# Altium footprint library THU.PcbLib: 477 footprints (part 4 of 30)
Each footprint in its own frame and in the unit in brackets; x right, y up, seen from the top. Pads: shape width x height; smd on the part's side, far side on the other; paste and mask are expansions set on the pad; w line width, h text height; cw(c..) or ccw(c..) is an arc to the next point about the centre after c.
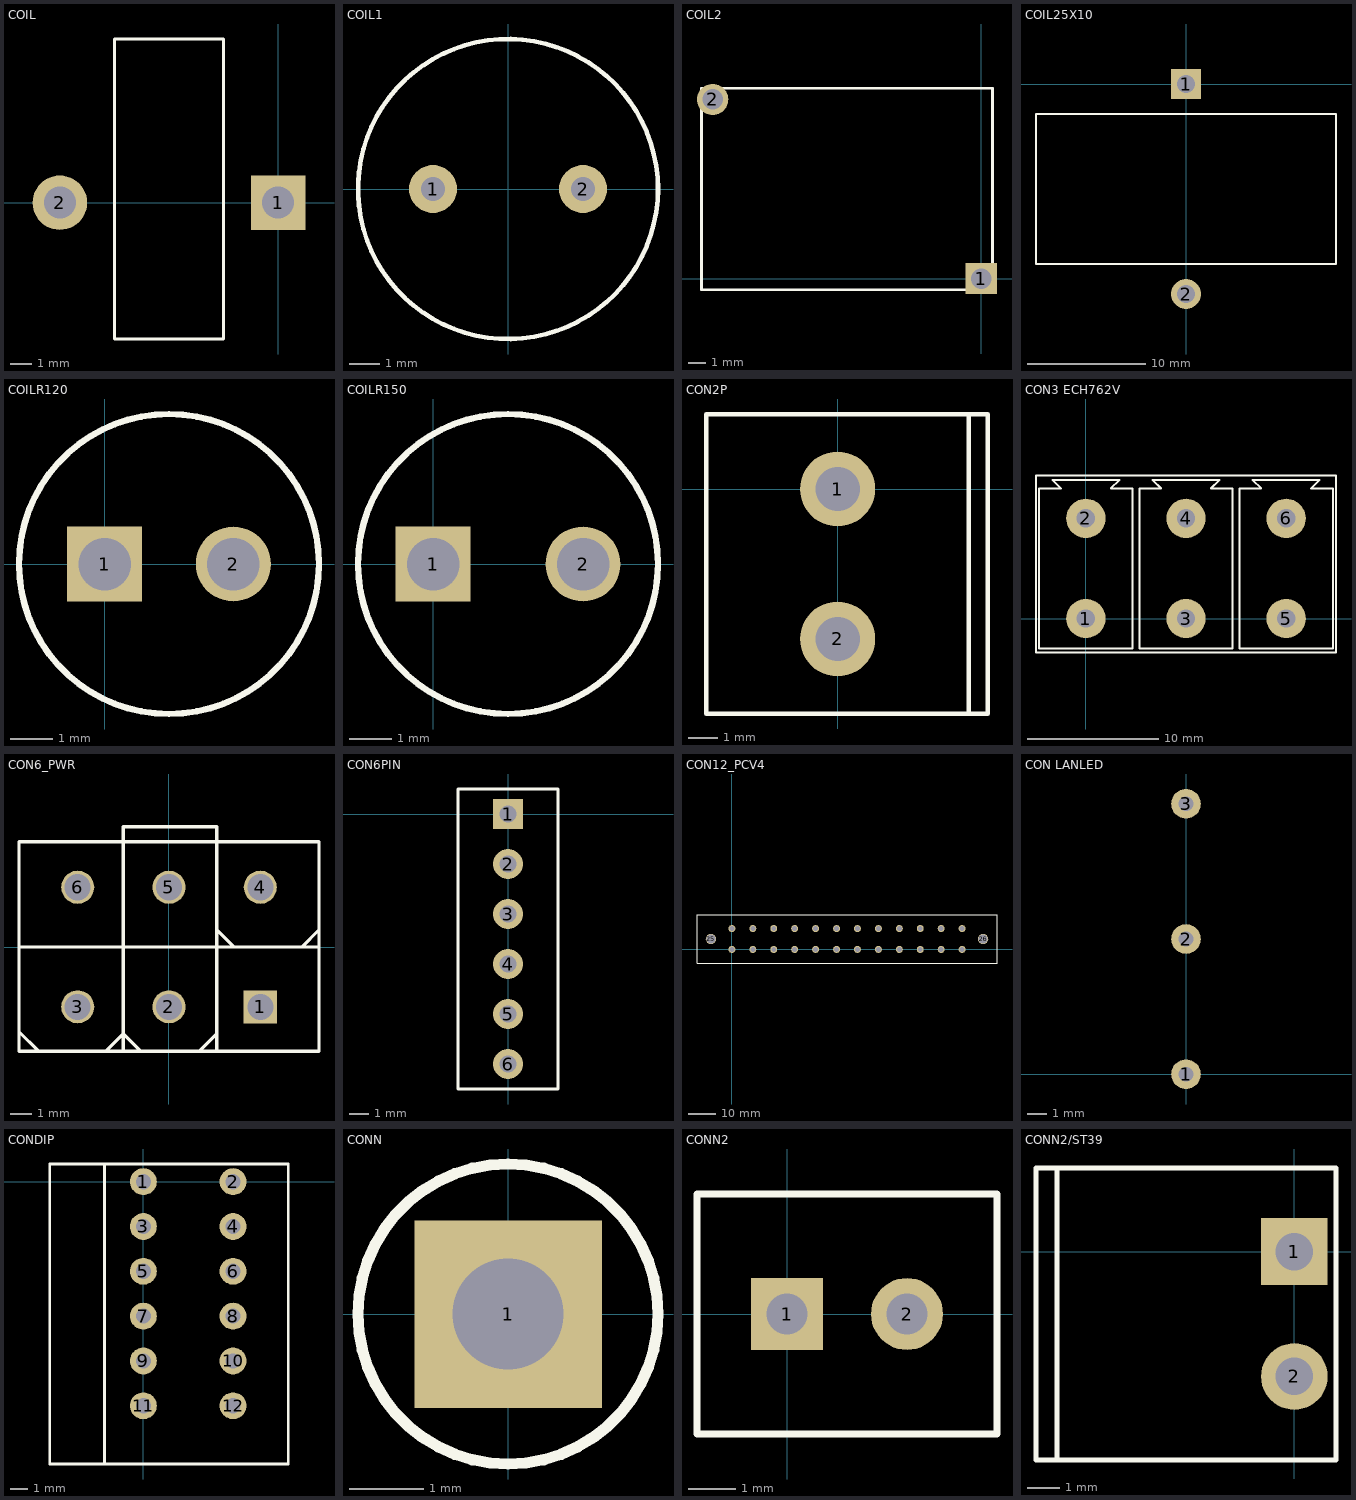
[diagram p3: the footprints below, top view; thin cyan lines are the x and y axes]

## COIL [mil]
pads (2):
  rect 100x100 hole 59: 1(0,0)
  round 100 hole 59: 2(-400,0)
TopOverlay:
  lines w6: -300,-250 -300,300 -100,300 -100,-250 -300,-250

## COIL1 [mm]
pads (2):
  round 1.6 hole 0.8: 1(-2.5,0) 2(2.5,0)
TopOverlay:
  circle w0.152: c0,0 r5

## COIL2 [mil]
pads (2):
  rect 70x70 hole 46: 1(0,0)
  round 70 hole 46: 2(-600,400)
TopOverlay:
  lines w6: -625,-25 25,-25 25,425 -625,425 -625,-25

## COIL25X10 [mil]
pads (2):
  rect 100x100 hole 59: 1(0,0)
  round 100 hole 59: 2(0,-700)
TopOverlay:
  lines w6: -500,-600 -500,-100 500,-100 500,-600 -500,-600

## COILR120 [mil]
pads (2):
  rect 70x70 hole 49: 1(0,0)
  round 70 hole 49: 2(120,0)
TopOverlay:
  circle w6: c60,0 r140

## COILR150 [mil]
pads (2):
  rect 70x70 hole 49: 1(0,0)
  round 70 hole 49: 2(140,0)
TopOverlay:
  circle w6: c70,0 r140

## CON2P [mil]
pads (2):
  round 100 hole 59: 1(0,0) 2(0,-200)
TopOverlay:
  lines w6: 175,-300 175,100 ; -175,-300 -175,100 200,100 200,-300 -175,-300

## CON3 ECH762V [mm] "ALTRONICS P/N P4232, ECH762V"
height 29
pads (6):
  round 3 hole 1.4: 1(0,0) 2(0,7.62) 3(7.62,0) 4(7.62,7.62) 5(15.24,0) 6(15.24,7.62)
TopOverlay:
  lines w0.152: -3.8,-2.6 19.04,-2.6 19.04,0 19.04,10.9 -3.8,10.9 -3.8,0 -3.8,-2.6 ; -3.556,-2.286 -3.556,9.906 -1.905,9.906 -2.54,10.541 2.54,10.541 1.905,9.906 3.556,9.906 3.556,-2.286 -3.556,-2.286 ; 4.064,-2.286 11.176,-2.286 11.176,9.906 9.525,9.906 10.16,10.541 5.08,10.541 5.715,9.906 4.064,9.906 4.064,-2.286 ; 11.684,-2.286 18.796,-2.286 18.796,9.906 17.145,9.906 17.78,10.541 12.7,10.541 13.335,9.906 11.684,9.906 11.684,-2.286

## CON6_PWR [mm]
pads (6):
  rect 1.524x1.524 hole 1.2: 1(4.2,-2.75)
  round 1.524 hole 1.2: 2(0,-2.75) 3(-4.2,-2.75) 4(4.2,2.75) 5(0,2.75) 6(-4.2,2.75)
TopOverlay:
  lines w0.152: -6.9,-3.9 -6,-4.8 ; -6.9,0 6.9,0 ; -2.9,-4.8 -2.1,-4 -1.3,-4.8 ; -2.1,-4.8 -2.1,4.839 -2.1,5.539 2.2,5.539 2.2,4.839 2.2,-4.8 ; 1.4,-4.8 2.2,-4 ; 2.2,0.8 3,0 ; 6.1,0 6.9,0.8 ; -6.9,-4.8 6.9,-4.8 6.9,4.839 -6.9,4.839 -6.9,-4.8 ; 2.2,-3.942 2.2,-3.842 2.2,-3.942 ; 2.2,0.55 2.2,0.65 2.2,0.55

## CON6PIN [mil]
pads (6):
  rect 60x60 hole 34: 1(0,0)
  round 60 hole 34: 2(0,-100) 3(0,-200) 4(0,-300) 5(0,-400) 6(0,-500)
TopOverlay:
  lines w6: -100,-550 -100,50 100,50 100,-550 -100,-550

## CON12_PCV4 [mil]
pads (26):
  round 100 hole 70: 1(0,0) 2(300,0) 3(600,0) 4(900,0) 5(1200,0) 6(1500,0) 7(1800,0) 8(2100,0) 9(2400,0) 10(2700,0) 11(3000,0) 12(3300,0) 13(0,300) 14(300,300) 15(600,300) 16(900,300) 17(1200,300) 18(1500,300) 19(1800,300) 20(2100,300) 21(2400,300) 22(2700,300) 23(3000,300) 24(3300,300)
  round 150 hole 125: 25(-300,150) 26(3600,150)
TopOverlay:
  lines w6: -500,-200 -500,500 3800,500 3800,-200 -500,-200

## CON LANLED [mil]
pads (3):
  round 60 hole 30: 1(0,0) 2(0,275) 3(0,550)

## CONDIP [mil]
pads (12):
  round 60 hole 34: 1(0,0) 2(200,0) 3(0,-100) 4(200,-100) 5(0,-200) 6(200,-200) 7(0,-300) 8(200,-300) 9(0,-400) 10(200,-400) 11(0,-500) 12(200,-500)
TopOverlay:
  lines w6: -86.61,-629.92 -86.61,39.37 ; -208.66,-629.92 322.83,-629.92 322.83,39.37 -208.66,39.37 -208.66,-629.92

## CONN [mil]
pads (1):
  rect 100x100 hole 59: 1(0,0)
TopOverlay:
  circle w6: c0,0 r80

## CONN2 [mil]
pads (2):
  rect 60x60 hole 34: 1(0,0)
  round 60 hole 34: 2(100,0)
TopOverlay:
  lines w6: -75,-100 175,-100 175,100 -75,100 -75,-100

## CONN2/ST39 [mil]
pads (2):
  rect 80x80 hole 45: 1(0,0)
  round 80 hole 45: 2(0,-150)
TopOverlay:
  lines w6: -285,-250 -285,100 ; -310,-250 -310,100 50,100 50,-250 -310,-250